# Altium footprint library JL_PCB.PCBLIB: 1129 footprints (part 54 of 72)
Each footprint in its own frame and in the unit in brackets; x right, y up, seen from the top. Pads: shape width x height; smd on the part's side, far side on the other; paste and mask are expansions set on the pad; w line width, h text height; cw(c..) or ccw(c..) is an arc to the next point about the centre after c.
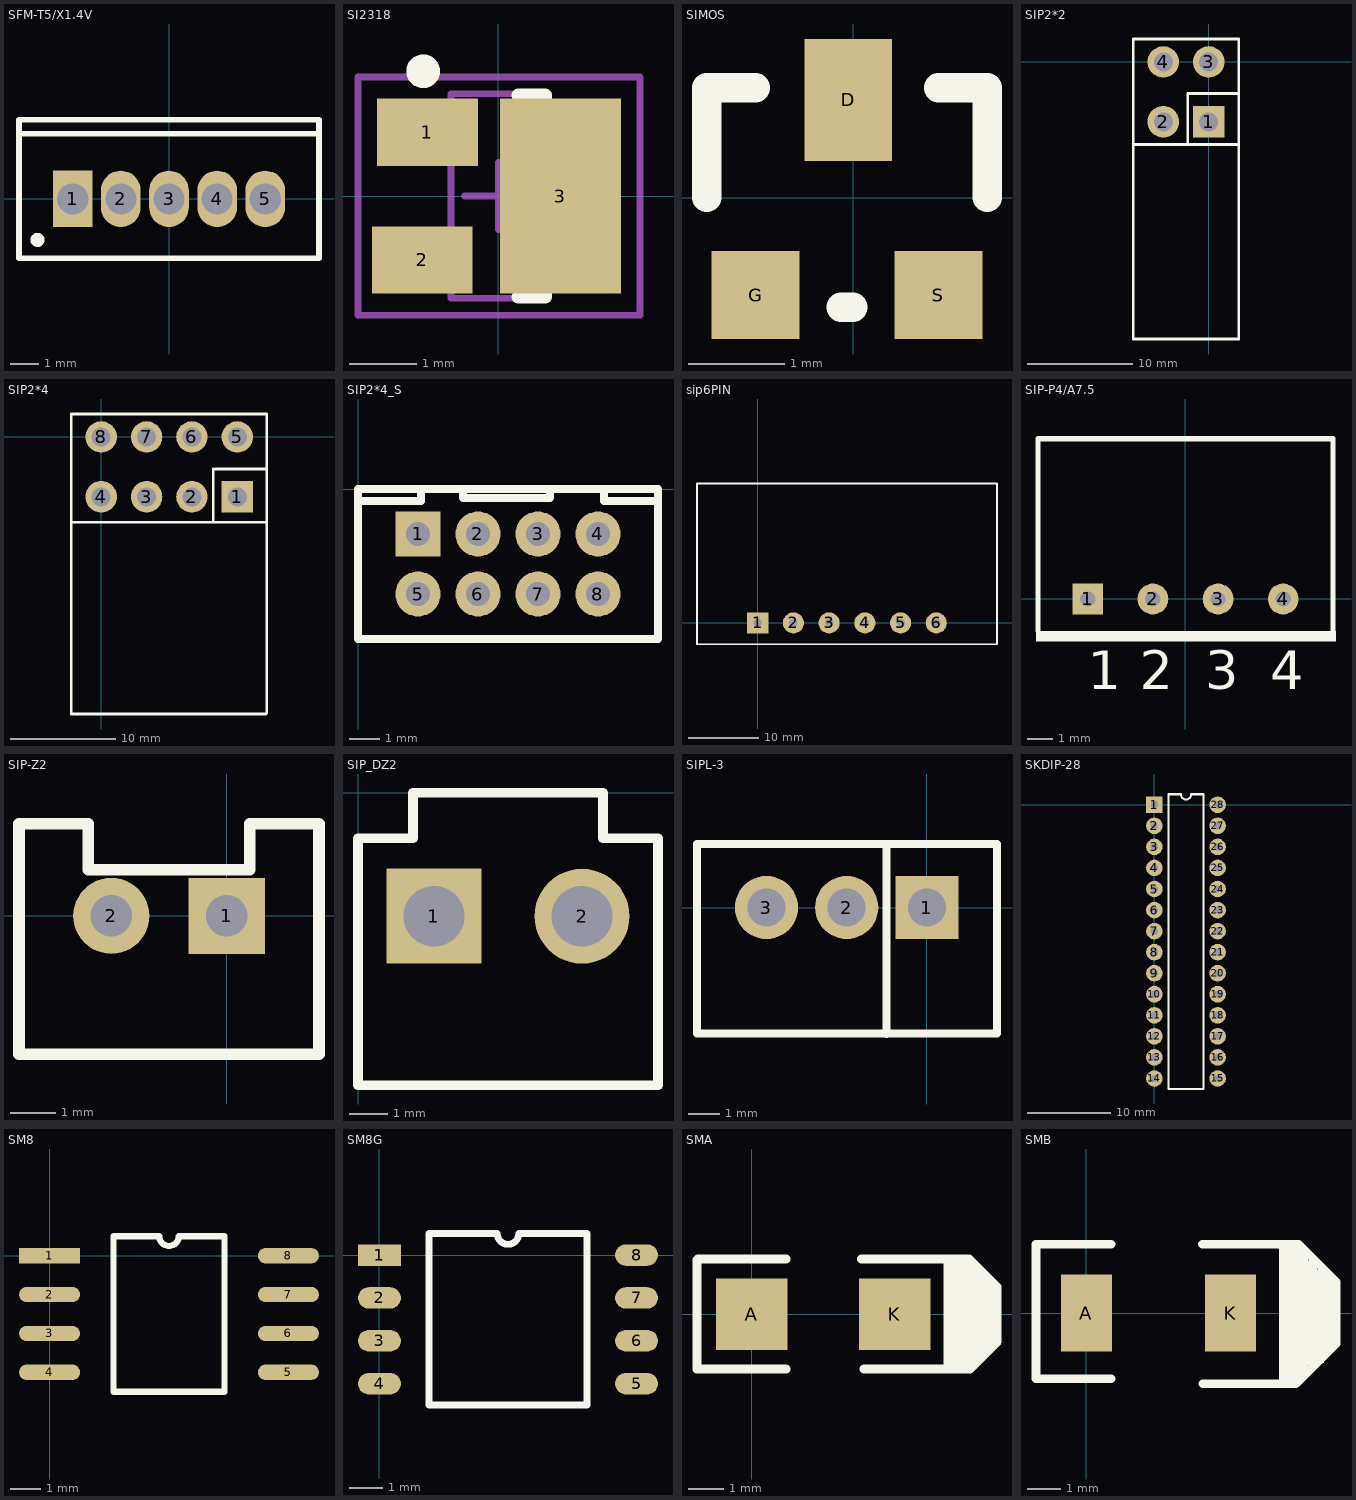
[diagram p53: the footprints below, top view; thin cyan lines are the x and y axes]

## SFM-T5/X1.4V [mm] "TO, Thru-Hole, Vertical, Heatsink Mounted; 5 In-Line Leads; Pitch 1.70 mm"
height 15.9
pads (5):
  rect 1.4x2 hole 1.1: 1(-3.4,0)
  oval 1.4x2 hole 1.1: 2(-1.7,0) 3(0,0) 4(1.7,0) 5(3.4,0)
TopOverlay:
  circle w0.25: c-4.65,-1.45 r0.125
  lines w0.2: -5.3,2.3 5.3,2.3 ; -5.3,-2.1 5.3,-2.1 5.3,2.8 -5.3,2.8 -5.3,-2.1
Mechanical13:
  lines w0.1: -5.3,2.3 5.3,2.3 ; -5.3,-2.1 -5.3,2.8 5.3,2.8 5.3,-2.1 -5.3,-2.1 ; -3.91,-0.28 -3.91,0.28 -2.89,0.28 -2.89,-0.28 -3.91,-0.28 ; -2.21,-0.28 -2.21,0.28 -1.19,0.28 -1.19,-0.28 -2.21,-0.28 ; -0.51,-0.28 -0.51,0.28 0.51,0.28 0.51,-0.28 -0.51,-0.28 ; 1.19,-0.28 1.19,0.28 2.21,0.28 2.21,-0.28 1.19,-0.28 ; 2.89,-0.28 2.89,0.28 3.91,0.28 3.91,-0.28 2.89,-0.28
Mechanical15:
  lines w0.1: -0.5,0 0.5,0 ; 0,-0.5 0,0.5
3D body: height 4.1, standoff 0, extent -0.509,-0.279 0.509,0.279
3D body: height 4.1, standoff 0, extent 2.891,-0.279 3.909,0.279
3D body: height 4.1, standoff 0, extent 1.191,-0.279 2.209,0.279
3D body: height 4.1, standoff 0, extent -2.209,-0.279 -1.191,0.279
3D body: height 4.1, standoff 0, extent -3.909,-0.279 -2.891,0.279
3D body: height 13, standoff 4.1, extent -5.35,-2.15 5.35,2.85
3D body: height 15.9, standoff 13, extent -5.299,2.301 5.299,2.799

## SI2318 [mm] "SOT23, 3-Leads, Body 3.0x2.6mm (max), Pitch 0.95mm, IPC Medium Density"
height 1.1
pads (3):
  rect 1.5x1 smd: 1(-1.052,0.95) 2(-1.128,-0.95)
  rect 1.8x2.9 smd: 3(0.925,0)
TopOverlay:
  circle w0.25: c-1.116,1.854 r0.125
  lines w0.2: 0.3,-1.5 0.7,-1.5 0.7,-0.7 ; 0.3,1.5 0.7,1.5 0.7,0.7
Mechanical13:
  lines w0.1: -0.7,-1.52 0.7,-1.52 0.7,1.52 -0.7,1.52 -0.7,-1.52
Mechanical15:
  lines w0.1: -0.5,0 0.5,0 ; 0,-0.5 0,0.5 ; -2.083,-1.77 2.108,-1.77 2.108,1.77 -2.083,1.77 -2.083,-1.77
3D body: height 1.1, standoff 0.05, extent -0.7,-1.52 0.7,1.52

## SIMOS [mil]
pads (3):
  rect 36x50 smd: D(-2,40)
  rect 36x36 smd: G(-40,-40) S(35,-40)
TopOverlay:
  lines w12: -60,0 -60,45 -40,45 ; -5,-45 0,-45 ; 35,45 55,45 55,0
3D body "CircuitWorks-SOT-23.step": height 43.91, standoff 0.6, extent -62.05,-44.21 56.06,54.21

## SIP2*2 [mm]
pads (4):
  rect 3x3 hole 1.8: 1(0,-5.69)
  round 3 hole 1.8: 2(-4.318,-5.69) 3(0,0) 4(-4.318,0)
TopOverlay:
  lines w0.254: -2,-7.849 -2,-3 2.845,-3 ; -7.163,-7.849 2.845,-7.849 ; -7.163,-7.849 -7.163,-26.349 2.845,-26.349 2.845,-7.849 ; -7.163,-7.849 -7.163,2.184 2.845,2.184 2.845,-7.849

## SIP2*4 [mm]
pads (8):
  rect 3x3 hole 1.8: 1(12.954,-5.69)
  round 3 hole 1.8: 2(8.636,-5.69) 3(4.318,-5.69) 4(0,-5.69) 5(12.954,0) 6(8.636,0) 7(4.318,0) 8(0,0)
TopOverlay:
  lines w0.254: -2.845,-8.1 15.664,-8.1 ; 10.668,-7.95 10.668,-3.048 ; 10.82,-3.048 15.748,-3.048 ; -2.845,-26.349 7.163,-26.349 15.669,-26.349 15.734,-26.283 15.734,2.184 15.354,2.184 -2.845,2.184 -2.845,-7.849 -2.845,-26.349

## SIP2*4_S [mm]
pads (8):
  rect 1.5x1.5 hole 0.8: 1(2,-1.5)
  round 1.5 hole 0.8: 2(4,-1.5) 3(6,-1.5) 4(8,-1.5) 5(2,-3.5) 6(4,-3.5) 7(6,-3.5) 8(8,-3.5)
TopOverlay:
  lines w0.254: 0,-0.4 2.1,-0.4 2.1,0 ; 3.5,0 3.5,-0.3 6.4,-0.3 6.4,0 ; 8.2,-0.2 8.2,-0.4 ; 8.2,0 8.2,-0.4 ; 10,-0.4 8.2,-0.4 ; 0,-5 10,-5 10,0 0,0 0,-5

## sip6PIN [mm]
pads (6):
  rect 3x3 hole 1.2: 1(0,0)
  round 3 hole 1.2: 2(5.08,0) 3(10.16,0) 4(15.24,0) 5(20.32,0) 6(25.4,0)
TopOverlay:
  lines w0.254: -8.636,-3.048 34.036,-3.048 34.036,19.812 -8.636,19.812 -8.636,-3.048

## SIP-P4/A7.5 [mm] "SIP; 4 Leads; Body 10 x 11.5 x 7.5 mm (typ); Pitch 2.54 mm"
height 10.6
pads (4):
  rect 1.2x1.2 hole 0.6: 1(-3.81,0)
  round 1.2 hole 0.6: 2(-1.27,0) 3(1.27,0) 4(3.81,0)
TopOverlay:
  rectangle: -5.83,-1.65 5.87,-1.25
  lines w0.2: -5.75,-1.25 -5.75,6.25 5.75,6.25 5.75,-1.25
  text "1" at -3.81,-3.52 h1.5
  text "2" at -1.778,-3.52 h1.5
  text "3" at 0.762,-3.52 h1.5
  text "4" at 3.302,-3.52 h1.5

## SIP-Z2 [mil]
pads (2):
  rect 66x66 hole 36: 1(0,0)
  round 66 hole 36: 2(-100,0)
TopOverlay:
  lines w10: -180,-120 -180,80 -120,80 -120,40 20,40 20,80 80,80 80,0 80,-120 -180,-120

## SIP_DZ2 [mm]
pads (2):
  rect 2.5x2.5 hole 1.6: 1(2,-3.25)
  round 2.5 hole 1.6: 2(5.9,-3.25)
TopOverlay:
  lines w0.254: 1.45,-0.002 1.45,-1.2 0,-1.2 0,-7.7 7.9,-7.7 7.9,-1.2 6.45,-1.2 6.45,-0.002 ; 1.45,0 6.45,0

## SIPL-3 [mm]
pads (3):
  rect 2x2 hole 1.2: 1(0,0)
  round 2 hole 1.2: 2(-2.54,0) 3(-5.08,0)
TopOverlay:
  lines w0.254: -5.28,2.008 -7.28,2.008 ; -1.28,-4 -1.28,2 ; -7.28,2.008 -7.28,-3.992 2.22,-3.992 2.22,2.008 -4.78,2.008 -7.28,2.008

## SKDIP-28 [mm]
pads (28):
  rect 2x2 hole 0.889: 1(0,0)
  round 2 hole 0.889: 2(0,-2.54) 3(0,-5.08) 4(0,-7.62) 5(0,-10.16) 6(0,-12.7) 7(0,-15.24) 8(0,-17.78) 9(0,-20.32) 10(0,-22.86) 11(0,-25.4) 12(0,-27.94) 13(0,-30.48) 14(0,-33.02) 15(7.62,-33.02) 16(7.62,-30.48) 17(7.62,-27.94) 18(7.62,-25.4) 19(7.62,-22.86) 20(7.62,-20.32) 21(7.62,-17.78) 22(7.62,-15.24) 23(7.62,-12.7) 24(7.62,-10.16) 25(7.62,-7.62) 26(7.62,-5.08) 27(7.62,-2.54) 28(7.62,0)
TopOverlay:
  lines w0.254: 1.676,-34.29 1.676,1.27 3.175,1.27 ccw(c3.81,1.27) 4.445,1.27 5.944,1.27 5.944,-34.29 1.676,-34.29

## SM8 [mm]
pads (8):
  rect 2x0.5 smd: 1(0,0)
  oval 2x0.5 smd: 2(0,-1.27) 3(0,-2.54) 4(0,-3.81) 5(7.8,-3.81) 6(7.8,-2.54) 7(7.8,-1.27) 8(7.8,0)
TopOverlay:
  lines w0.2: 2.085,-4.445 5.715,-4.445 5.715,0.635 4.217,0.635 cw(c3.9,0.635) 3.582,0.635 2.085,0.635 2.085,-4.445

## SM8G [mil]
pads (8):
  rect 50x25 smd: 1(0,0)
  oval 50x25 smd: 2(0,-50) 3(0,-100) 4(0,-150) 5(300,-150) 6(300,-100) 7(300,-50) 8(300,0)
TopOverlay:
  lines w8: 58,-175 242,-175 242,25 162.5,25 cw(c150,25) 137.5,25 58,25 58,-175

## SMA [mm]
pads (2):
  rect 2x2 smd: A(0,0) K(4,0)
TopOverlay:
  rectangle: 5.486,-1.473 6.147,1.524
  rectangle: 5.486,-1.295 6.379,1.241
  rectangle: 6.223,-1.118 6.625,0.995
  rectangle: 6.325,-0.61 6.858,0.762
  rectangle: 6.35,-0.762 6.858,-0.381
  lines w0.254: -1.524,1.524 -1.524,-1.524 0.965,-1.524 ; -1.499,1.549 0.965,1.549 ; 3.073,1.549 5.486,1.549 6.02,1.549 6.071,1.549 6.833,0.787 6.858,0.762 6.858,-0.762 6.147,-1.473 6.096,-1.524 5.486,-1.524 ; 3.15,-1.524 5.486,-1.524 ; 5.486,1.524 5.486,-1.524 ; 6.262,1.358 6.262,1.033 6.262,0.825 6.431,0.995 6.498,0.995 6.858,0.635 ; 6.579,-0.838 6.579,-0.61

## SMB [mm]
pads (2):
  rect 1.52x2.3 smd: A(0,0) K(4.3,0)
TopOverlay:
  rectangle: 5.867,-2.108 6.248,1.956
  rectangle: 6.248,-1.981 6.376,1.956
  rectangle: 6.376,-1.864 6.492,1.956
  rectangle: 6.492,-1.864 6.601,1.781
  rectangle: 6.756,-1.482 6.875,1.626
  rectangle: 6.528,-1.565 6.791,1.575
  rectangle: 6.756,-1.482 7.083,1.299
  rectangle: 6.833,-1.092 7.442,0.94
  rectangle: 7.041,0.737 7.214,1.341
  rectangle: 7.191,0.737 7.214,1.191
  rectangle: 7.041,0.737 7.366,1.016
  lines w0.254: 0.744,-1.956 -1.499,-1.956 -1.499,2.057 0.749,2.057 ; 3.457,2.057 5.766,2.057 ; 3.475,-2.108 5.867,-2.108 ; 5.766,2.057 5.867,1.956 5.867,-2.108 ; 5.766,2.057 6.325,2.057 7.366,1.016 7.442,0.94 7.442,-0.914 6.248,-2.108 5.867,-2.108